# Altium footprint library Elettronica FM.PcbLib: 387 footprints (part 12 of 25)
Each footprint in its own frame and in the unit in brackets; x right, y up, seen from the top. Pads: shape width x height; smd on the part's side, far side on the other; paste and mask are expansions set on the pad; w line width, h text height; cw(c..) or ccw(c..) is an arc to the next point about the centre after c.
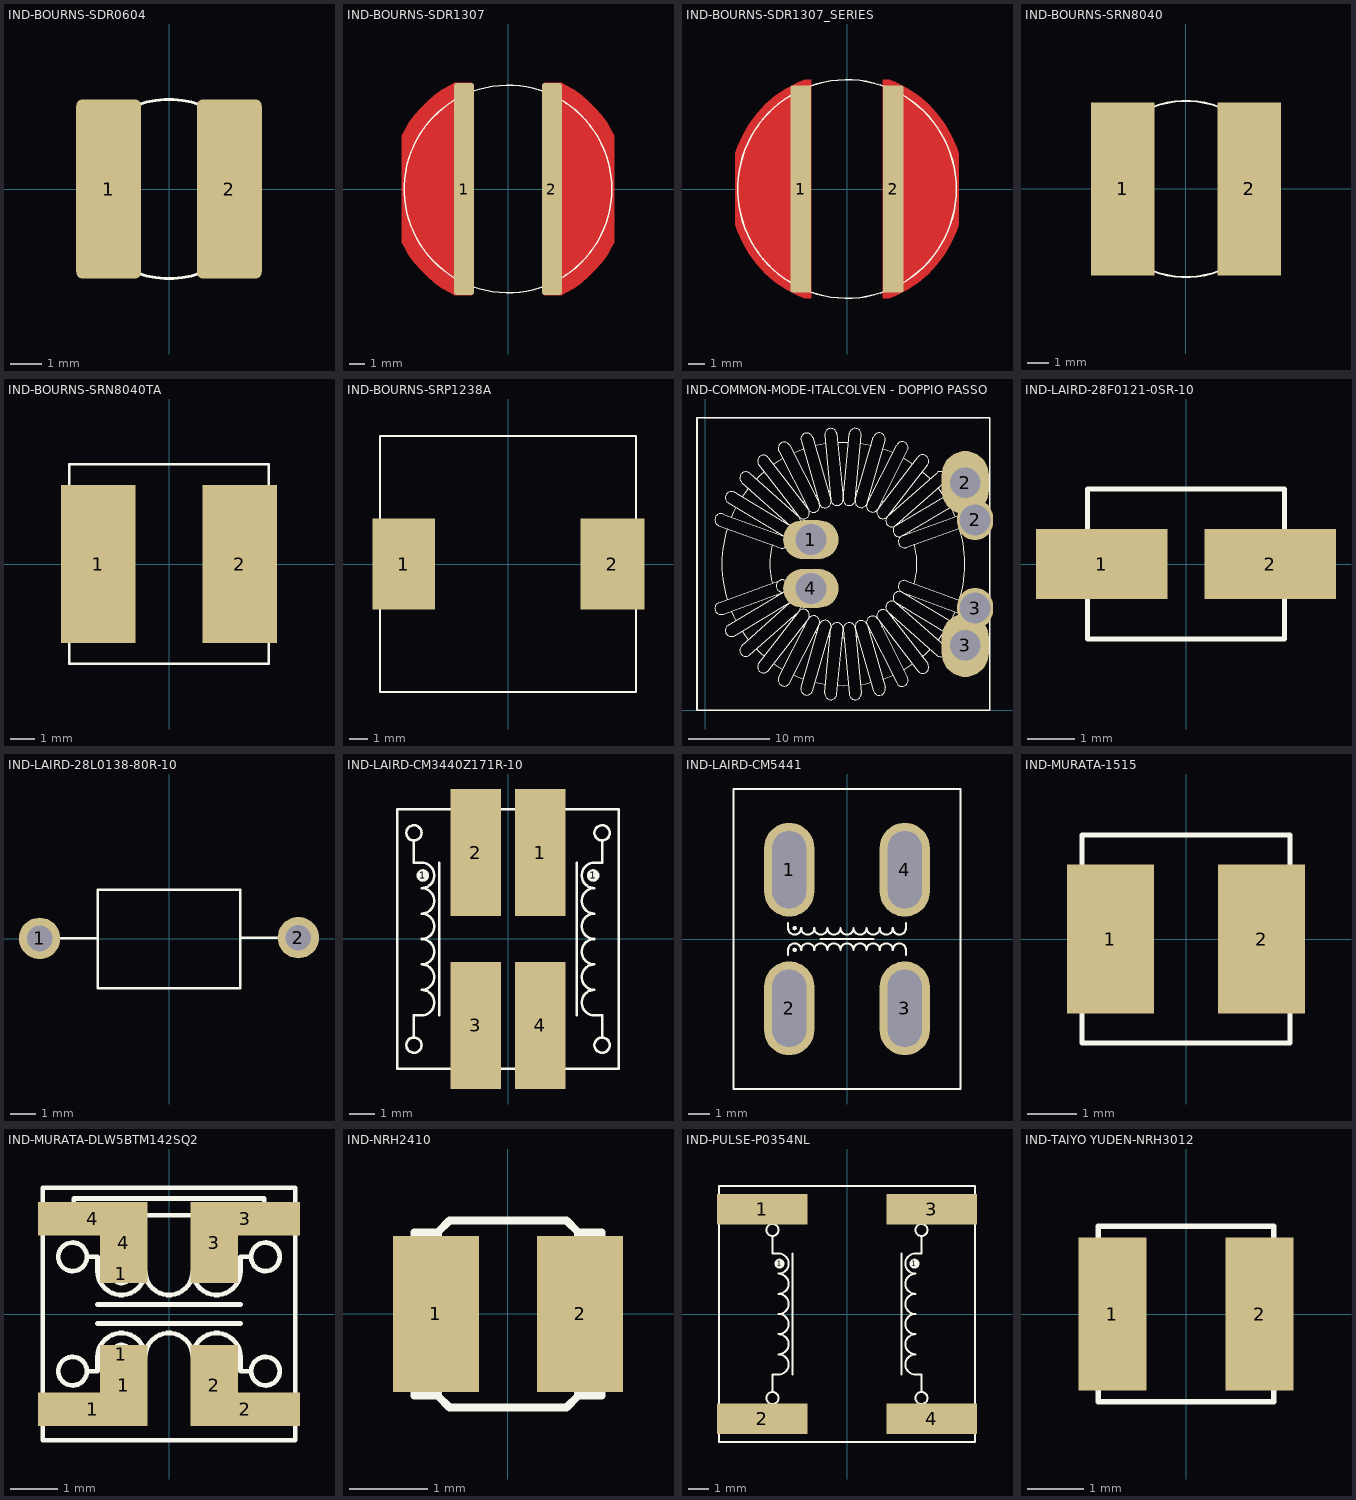
[diagram p11: the footprints below, top view; thin cyan lines are the x and y axes]

## IND-BOURNS-SDR0604 [mm]
height 1.9
pads (2):
  rrect20% 2.1x5.8 smd: 1(-1.95,0) 2(1.95,0)
Top Overlay:
  circle w0.1: c0,0 r2.9
3D body: height 2.4, standoff 0, extent -2.9,-2.899 2.9,2.899

## IND-BOURNS-SDR1307 [mm]
pads (2):
  rrect25% 1.3x14 smd: 1(-2.9,0) 2(2.9,0)
Top Layer:
  region: 3.551,7.001 3.827,6.861 4.357,6.537 4.859,6.173 5.331,5.77 5.77,5.331 6.173,4.859 6.537,4.357 6.861,3.827 7.001,3.551 7.001,-3.551 6.861,-3.827 6.537,-4.357 6.173,-4.859 5.77,-5.331 5.331,-5.77 4.859,-6.173 4.357,-6.537 3.827,-6.861 3.551,-7.001 2.401,-7.001 2.4,-7 2.4,7 2.401,7.001
  region: -3.551,-7.001 -3.827,-6.861 -4.357,-6.537 -4.859,-6.173 -5.331,-5.77 -5.77,-5.331 -6.173,-4.859 -6.537,-4.357 -6.861,-3.827 -7.001,-3.551 -7.001,3.551 -6.861,3.827 -6.537,4.357 -6.173,4.859 -5.77,5.331 -5.331,5.77 -4.859,6.173 -4.357,6.537 -3.827,6.861 -3.551,7.001 -2.401,7.001 -2.4,7 -2.4,-7 -2.401,-7.001
Top Overlay:
  circle w0.1: c0,0 r6.85
Top Solder:
  region: 3.575,-7.101 3.859,-6.958 4.401,-6.629 4.915,-6.257 5.397,-5.846 5.846,-5.397 6.257,-4.915 6.629,-4.401 6.958,-3.859 7.101,-3.575 7.1,-3.575 7.1,3.575 7.101,3.575 6.958,3.859 6.629,4.401 6.257,4.915 5.846,5.397 5.397,5.846 4.915,6.257 4.401,6.629 3.859,6.958 3.575,7.101 3.575,7.1 2.15,7.1 2.15,-7.1
  region: -3.575,-7.101 -3.859,-6.958 -4.401,-6.629 -4.915,-6.257 -5.397,-5.846 -5.846,-5.397 -6.257,-4.915 -6.629,-4.401 -6.958,-3.859 -7.101,-3.575 -7.1,-3.575 -7.1,3.575 -7.101,3.575 -6.958,3.859 -6.629,4.401 -6.257,4.915 -5.846,5.397 -5.397,5.846 -4.915,6.257 -4.401,6.629 -3.859,6.958 -3.575,7.101 -3.575,7.1 -2.15,7.1 -2.15,-7.1
3D body: height 7.3, standoff 0, extent -6.85,-6.847 6.85,6.847

## IND-BOURNS-SDR1307_SERIES [mm]
pads (2):
  rrect25% 1.3x13 smd: 1(-2.9,0) 2(2.9,0)
Top Layer:
  region: 2.674,-6.846 3.054,-6.698 3.778,-6.318 4.455,-5.86 5.077,-5.33 5.637,-4.734 6.127,-4.08 6.542,-3.376 6.876,-2.63 7,-2.241 7.002,-2.241 7,2.241 6.876,2.63 6.542,3.376 6.127,4.08 5.637,4.734 5.077,5.33 4.455,5.86 3.778,6.318 3.054,6.698 2.674,6.846 2.25,6.846 2.25,-6.846
  region: -2.674,-6.846 -3.054,-6.698 -3.778,-6.318 -4.455,-5.86 -5.077,-5.33 -5.637,-4.734 -6.127,-4.08 -6.542,-3.376 -6.876,-2.63 -7,-2.241 -7.002,-2.241 -7,2.241 -6.876,2.63 -6.542,3.376 -6.127,4.08 -5.637,4.734 -5.077,5.33 -4.455,5.86 -3.778,6.318 -3.054,6.698 -2.674,6.846 -2.25,6.846 -2.25,-6.846
Top Overlay:
  circle w0.1: c0,0 r6.85
Top Solder:
  region: 2.73,-6.953 3.11,-6.799 3.834,-6.412 4.512,-5.949 5.137,-5.416 5.701,-4.82 6.197,-4.167 6.621,-3.464 6.968,-2.719 7.1,-2.331 7.1,2.34 6.968,2.728 6.622,3.471 6.199,4.172 5.704,4.824 5.141,5.42 4.517,5.951 3.841,6.413 3.119,6.8 2.739,6.953 2.15,6.953 2.15,-6.953
  region: -2.73,-6.953 -3.11,-6.799 -3.834,-6.412 -4.512,-5.949 -5.137,-5.416 -5.701,-4.82 -6.197,-4.167 -6.621,-3.464 -6.968,-2.719 -7.1,-2.331 -7.1,2.34 -6.968,2.728 -6.622,3.471 -6.199,4.172 -5.704,4.824 -5.141,5.42 -4.517,5.951 -3.841,6.413 -3.119,6.8 -2.739,6.953 -2.15,6.953 -2.15,-6.953
3D body: height 7.3, standoff 0, extent -6.85,-6.847 6.85,6.847

## IND-BOURNS-SRN8040 [mm]
height 12
pads (2):
  rect 3x8.2 smd mask+0.1: 1(-3,0) 2(3,0)
Top Overlay:
  circle w0.1: c0,0 r4.175
3D body: height 4, standoff 0, extent -4.175,-4.175 4.175,4.175

## IND-BOURNS-SRN8040TA [mm]
height 12
pads (2):
  rect 3.1x6.6 smd mask+0.1: 1(-2.95,0) 2(2.95,0)
Top Overlay:
  lines w0.1: -4.15,-4.15 4.15,-4.15 4.15,4.15 -4.15,4.15 -4.15,-4.15
3D body: height 4.5, standoff 0, extent -4.15,-4.15 4.15,4.15

## IND-BOURNS-SRP1238A [mm]
pads (2):
  rect 3.4x5 smd: 1(-5.7,0)
  rect 3.5x5 smd: 2(5.7,0)
Top Overlay:
  lines w0.1: -7,-7 -7,7 7,7 7,-7 -7,-7
3D body: height 3.5, standoff 0, extent -7,-7 7,7

## IND-COMMON-MODE-ITALCOLVEN - DOPPIO PASSO [mm]
height 20
pads (6):
  oval 6.8x4.8 hole 3.8: 1(13,21) 4(13,15)
  oval 5.8x7.8 hole 3.8: 2(32,28) 3(32,8)
  oval 4.4x5 hole 3.8 mask+0.1: 2(33.2,23.425) 3(33.2,12.575)
Top Overlay:
  drawing of 174 lines, arcs and shapes, not listed
Mechanical 1:
  lines w0.2: 0,36 34,36
3D body: height 27, standoff 2.5, extent -0.98,0 35,35.99
3D body: height 2.5, standoff 0, extent -1,0 35,36

## IND-LAIRD-28F0121-0SR-10 [mm]
height 16.6
pads (2):
  rect 2.8x1.5 smd paste-0.05: 1(-1.8,0) 2(1.8,0)
Top Overlay:
  lines w0.1: -1.9,-0.675 -2.1,-0.675 -2.55,-0.675 -2.55,0.675 -2.1,0.675 -1.9,0.675 ; -1.7,-0.675 -1.5,-0.675 ; -1.7,0.675 -1.5,0.675 ; -1.3,-0.675 -1.1,-0.675 ; -1.3,0.675 -1.1,0.675 ; -0.9,-0.675 -0.5,-0.675 -0.5,-0.475 ; -0.9,0.675 -0.5,0.675 -0.5,0.575 ; -0.5,-0.275 -0.5,-0.075 ; -0.5,0.125 -0.5,0.325 ; 0.5,-0.475 0.5,-0.675 0.9,-0.675 ; 0.5,-0.275 0.5,-0.075 ; 0.5,0.125 0.5,0.325 ; 0.5,0.575 0.5,0.675 0.9,0.675 ; 1.1,-0.675 1.3,-0.675 ; 1.1,0.675 1.3,0.675 ; 1.5,-0.675 1.7,-0.675 ; 1.5,0.675 1.7,0.675 ; 1.9,-0.675 2.1,-0.675 2.55,-0.675 2.55,0.675 2.1,0.675 1.9,0.675 ; -2.1,-1.6 -2.1,1.6 2.1,1.6 2.1,-1.6 -2.1,-1.6
3D body: height 1.3, standoff 0, extent 0.5,-0.675 2.55,0.675
3D body: height 1.3, standoff 0, extent -2.55,-0.675 -0.5,0.675
3D body: height 2.7, standoff 0.3, extent -2.1,-1.6 2.1,1.6

## IND-LAIRD-28L0138-80R-10 [mm]
height 16.6
pads (2):
  round 1.6 hole 1 paste-0.05: 1(-5,0.025) 2(5,0.05)
Top Overlay:
  lines w0.1: -5,0.025 -2.75,0.025 ; 2.75,0.05 5,0.05 ; -2.75,-1.9 -2.75,1.9 2.75,1.9 2.75,-1.9 -2.75,-1.9

## IND-LAIRD-CM3440Z171R-10 [mm]
pads (6):
  round 0.5 on Top Overlay mask+0.1: 1(-3.35,2.5) 1(3.35,2.5)
  rect 2x5 smd mask+0.1: 1(1.27,3.4) 2(-1.27,3.4) 3(-1.27,-3.4) 4(1.27,-3.4)
Top Overlay:
  circle w0.1: c3.7,-4.175 r0.3
  circle w0.1: c3.7,4.175 r0.3
  circle w0.1: c-3.7,4.175 r0.3
  circle w0.1: c-3.7,-4.175 r0.3
  lines w0.1: -3.7,-3.875 -3.7,-3 -3.4,-3 ccw(c-3.4,-2.5) -3.4,-2 ccw(c-3.4,-1.5) -3.4,-1 ccw(c-3.4,-0.5) -3.4,0 ccw(c-3.4,0.5) -3.4,1 ccw(c-3.4,1.5) -3.4,2 ccw(c-3.4,2.5) -3.4,3 -3.7,3 -3.7,3.875 ; -2.7,-3 -2.7,3 ; -1.65,-5.1 -1.65,-5.45 -0.9,-5.45 -0.9,-5.1 ; -1.65,5.1 -1.65,5.45 -0.9,5.45 -0.9,5.1 ; 0.9,-5.1 0.9,-5.45 1.65,-5.45 1.65,-5.1 ; 0.9,5.1 0.9,5.45 1.65,5.45 1.65,5.1 ; 2.7,-3 2.7,3 ; 3.7,-3.875 3.7,-3 3.4,-3 cw(c3.4,-2.5) 3.4,-2 cw(c3.4,-1.5) 3.4,-1 cw(c3.4,-0.5) 3.4,0 cw(c3.4,0.5) 3.4,1 cw(c3.4,1.5) 3.4,2 cw(c3.4,2.5) 3.4,3 3.7,3 3.7,3.875 ; -4.35,-5.1 4.35,-5.1 4.35,5.1 -4.35,5.1 -4.35,-5.1
3D body: height 10.5, standoff 0, extent -4.35,-5.1 4.35,5.1

## IND-LAIRD-CM5441 [mm]
pads (6):
  oval 2.3x4.3 hole 1.55 slot 3.55 at 90 deg: 1(-2.65,3.175) 2(-2.65,-3.175) 3(2.65,-3.175) 4(2.65,3.175)
  round 0.2 on Top Overlay mask+0.1: 3(-2.4,-0.5) 3(-2.4,0.5)
Top Overlay:
  lines w0.1: -2.7,-0.725 -2.7,-0.5 cw(c-2.4,-0.5) -2.1,-0.5 cw(c-1.8,-0.5) -1.5,-0.5 cw(c-1.2,-0.5) -0.9,-0.5 cw(c-0.6,-0.5) -0.3,-0.5 cw(c0,-0.5) 0.3,-0.5 cw(c0.6,-0.5) 0.9,-0.5 cw(c1.2,-0.5) 1.5,-0.5 cw(c1.8,-0.5) 2.1,-0.5 cw(c2.4,-0.5) 2.7,-0.5 2.7,-0.725 ; -2.7,0.725 -2.7,0.5 ccw(c-2.4,0.5) -2.1,0.5 ccw(c-1.8,0.5) -1.5,0.5 ccw(c-1.2,0.5) -0.9,0.5 ccw(c-0.6,0.5) -0.3,0.5 ccw(c0,0.5) 0.3,0.5 ccw(c0.6,0.5) 0.9,0.5 ccw(c1.2,0.5) 1.5,0.5 ccw(c1.8,0.5) 2.1,0.5 ccw(c2.4,0.5) 2.7,0.5 2.7,0.725 ; -1.2,0 1.2,0 ; -5.2,-6.875 5.2,-6.875 5.2,6.875 -5.2,6.875 -5.2,-6.875
3D body: height 15.3, standoff 0, extent -5.2,-6.875 5.2,6.875

## IND-MURATA-1515 [mm]
height 1.9
pads (2):
  rect 1.75x3 smd mask+0.075: 1(-1.525,0) 2(1.525,0)
Top Overlay:
  lines w0.1: -2.1,-2.1 2.1,-2.1 2.1,2.1 -2.1,2.1 -2.1,-2.1
3D body: height 2.2, standoff 0, extent -2.1,-2.1 2.1,2.1

## IND-MURATA-DLW5BTM142SQ2 [mm]
pads (10):
  rect 2.3x0.7 smd mask+0.1: 1(-1.6,-2) 2(1.6,-2) 3(1.6,2) 4(-1.6,2)
  round 0.5 on Top Overlay mask+0.1: 1(-1,-0.85) 1(-1,0.85)
  rect 1x1.7 smd mask+0.1: 1(-0.95,-1.5) 2(0.95,-1.5) 3(0.95,1.5) 4(-0.95,1.5)
Top Overlay:
  circle w0.1: c-2.025,1.2 r0.3
  circle w0.1: c2.025,1.2 r0.3
  circle w0.1: c2.025,-1.2 r0.3
  circle w0.1: c-2.025,-1.2 r0.3
  lines w0.1: -1.725,-1.2 -1.5,-1.2 -1.5,-0.9 cw(c-1,-0.9) -0.5,-0.9 cw(c0,-0.9) 0.5,-0.9 cw(c1,-0.9) 1.5,-0.9 1.5,-1.2 1.725,-1.2 ; -1.725,1.2 -1.5,1.2 -1.5,0.9 ccw(c-1,0.9) -0.5,0.9 ccw(c0,0.9) 0.5,0.9 ccw(c1,0.9) 1.5,0.9 1.5,1.2 1.725,1.2 ; -1.5,-0.2 1.5,-0.2 ; -1.5,0.2 1.5,0.2 ; -2.65,-2.65 2.65,-2.65 2.65,2.65 -2.65,2.65 -2.65,-2.65 ; -2,2.075 -2,2.425 2,2.425 2,2.075 -2,2.075
3D body: height 2.5, standoff 0, extent -2.65,-2.65 2.65,2.65

## IND-NRH2410 [mm]
height 1.7
pads (2):
  rect 1.1x2 smd: 1(-0.925,0) 2(0.925,0)
Top Overlay:
  lines w0.1: -0.9,-1.05 -0.75,-1.2 0.75,-1.2 0.9,-1.05 ; -0.9,-1.05 -1.2,-1.05 -1.2,1.05 -0.9,1.05 ; -0.9,-1.05 -0.9,1.05 ; -0.9,1.05 -0.75,1.2 0.75,1.2 0.9,1.05 ; 0.9,-1.05 1.2,-1.05 1.2,1.05 0.9,1.05 ; 0.9,-1.05 0.9,1.05
3D body: height 1, standoff 0, extent -1.2,-1.2 1.2,1.2

## IND-PULSE-P0354NL [mm]
pads (6):
  rect 4.5x1.5 smd mask+0.1: 1(-4.2,5.2) 2(-4.2,-5.2) 3(4.2,5.2) 4(4.2,-5.2)
  round 0.5 on Top Overlay mask+0.1: 1(-3.35,2.5) 1(3.35,2.5)
Top Overlay:
  circle w0.1: c-3.7,-4.175 r0.3
  circle w0.1: c-3.7,4.175 r0.3
  circle w0.1: c3.7,4.175 r0.3
  circle w0.1: c3.7,-4.175 r0.3
  lines w0.1: -3.7,-3.875 -3.7,-3 -3.4,-3 ccw(c-3.4,-2.5) -3.4,-2 ccw(c-3.4,-1.5) -3.4,-1 ccw(c-3.4,-0.5) -3.4,0 ccw(c-3.4,0.5) -3.4,1 ccw(c-3.4,1.5) -3.4,2 ccw(c-3.4,2.5) -3.4,3 -3.7,3 -3.7,3.875 ; -2.7,-3 -2.7,3 ; 2.7,-3 2.7,3 ; 3.7,-3.875 3.7,-3 3.4,-3 cw(c3.4,-2.5) 3.4,-2 cw(c3.4,-1.5) 3.4,-1 cw(c3.4,-0.5) 3.4,0 cw(c3.4,0.5) 3.4,1 cw(c3.4,1.5) 3.4,2 cw(c3.4,2.5) 3.4,3 3.7,3 3.7,3.875 ; -6.35,-6.35 -6.35,6.35 6.35,6.35 6.35,-6.35 -6.35,-6.35
3D body: height 5.5, standoff 0, extent -6.35,-6.35 6.35,6.35

## IND-TAIYO YUDEN-NRH3012 [mm]
height 1.9
pads (2):
  rect 1.2x2.7 smd mask+0.075: 1(-1.3,0) 2(1.3,0)
Top Overlay:
  lines w0.1: -1.55,-1.55 1.55,-1.55 1.55,1.55 -1.55,1.55 -1.55,-1.55
3D body: height 1.2, standoff 0, extent -1.55,-1.55 1.55,1.55